# Altium footprint library IC SMD QUAD.PCBLIB: 81 footprints (part 6 of 6)
Each footprint in its own frame and in the unit in brackets; x right, y up, seen from the top. Pads: shape width x height; smd on the part's side, far side on the other; paste and mask are expansions set on the pad; w line width, h text height; cw(c..) or ccw(c..) is an arc to the next point about the centre after c.
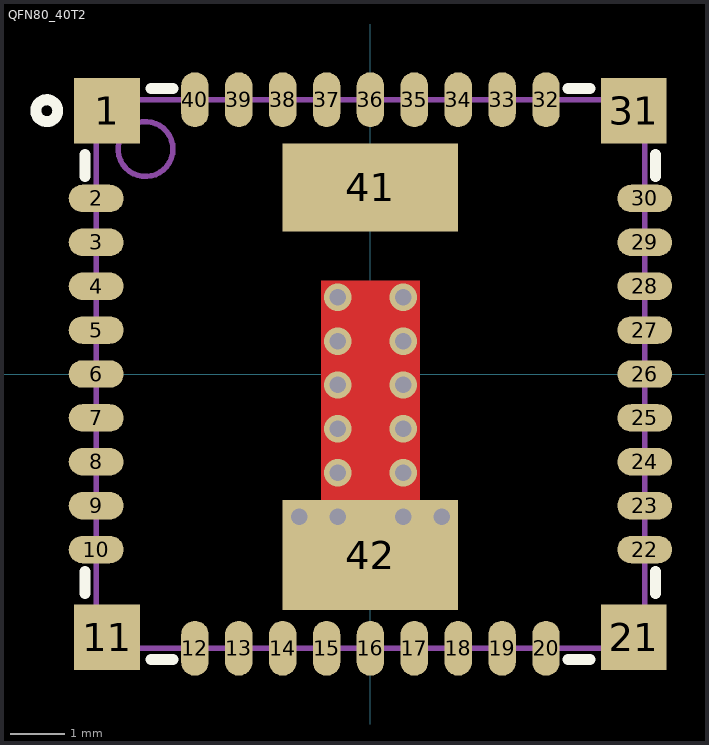
[diagram p5: the footprint, top view; thin cyan lines are the x and y axes]

## QFN80_40T2 [mm] "QFN, 40-Leads, Body 10x10mm, Pitch 0.80mm RVQ (TI)"
height 4.4
pads (42):
  rect 1.2x1.2 smd mask+0.1: 1(-4.8,4.8) 11(-4.8,-4.8) 21(4.8,-4.8) 31(4.8,4.8)
  oval 1x0.5 smd mask+0.1: 2(-5,3.2) 3(-5,2.4) 4(-5,1.6) 5(-5,0.8) 6(-5,0) 7(-5,-0.8) 8(-5,-1.6) 9(-5,-2.4) 10(-5,-3.2) 22(5,-3.2) 23(5,-2.4) 24(5,-1.6) 25(5,-0.8) 26(5,0) 27(5,0.8) 28(5,1.6) 29(5,2.4) 30(5,3.2)
  oval 0.5x1 smd mask+0.1: 12(-3.2,-5) 13(-2.4,-5) 14(-1.6,-5) 15(-0.8,-5) 16(0,-5) 17(0.8,-5) 18(1.6,-5) 19(2.4,-5) 20(3.2,-5) 32(3.2,5) 33(2.4,5) 34(1.6,5) 35(0.8,5) 36(0,5) 37(-0.8,5) 38(-1.6,5) 39(-2.4,5) 40(-3.2,5)
  rect 3.2x1.6 smd mask+0.1: 41(0,3.4)
  rect 3.2x2 smd mask+0.1: 42(0,-3.3)
via -0.6,1.4 diameter 0.5 hole 0.3
via -0.6,0.6 diameter 0.5 hole 0.3
via -0.6,-0.2 diameter 0.5 hole 0.3
via -0.6,-1 diameter 0.5 hole 0.3
via -0.6,-1.8 diameter 0.5 hole 0.3
via -0.6,-2.6 diameter 0.5 hole 0.3
via -1.3,-2.6 diameter 0.5 hole 0.3
via 1.3,-2.6 diameter 0.5 hole 0.3
via 0.6,-2.6 diameter 0.5 hole 0.3
via 0.6,-1.8 diameter 0.5 hole 0.3
via 0.6,-1 diameter 0.5 hole 0.3
via 0.6,-0.2 diameter 0.5 hole 0.3
via 0.6,0.6 diameter 0.5 hole 0.3
via 0.6,1.4 diameter 0.5 hole 0.3
TopLayer:
  rectangle: -0.9,-2.4 0.9,1.7
TopOverlay:
  circle w0.2: c-5.9,4.8 r0.2
  lines w0.2: -5.2,-4 -5.2,-3.6 ; -5.2,3.6 -5.2,4 ; -4,-5.2 -3.6,-5.2 ; -4,5.2 -3.6,5.2 ; 3.6,-5.2 4,-5.2 ; 3.6,5.2 4,5.2 ; 5.2,-4 5.2,-3.6 ; 5.2,3.6 5.2,4
TopPaste:
  rectangle: -0.7,-1.9 0.7,1.6
TopSolder:
  rectangle: -1.7,-4.3 1.7,-2.9
  rectangle: -0.9,-2.9 0.9,1.8
Mechanical13:
  circle w0.1: c-4.1,4.1 r0.5
  lines w0.1: -5,-5 -5,5 5,5 5,-5 -5,-5
3D body: height 4.4, standoff 0.08, extent -5,-5 5,5